# Altium footprint library PcbLib1.PcbLib: 170 footprints (part 8 of 11)
Each footprint in its own frame and in the unit in brackets; x right, y up, seen from the top. Pads: shape width x height; smd on the part's side, far side on the other; paste and mask are expansions set on the pad; w line width, h text height; cw(c..) or ccw(c..) is an arc to the next point about the centre after c.
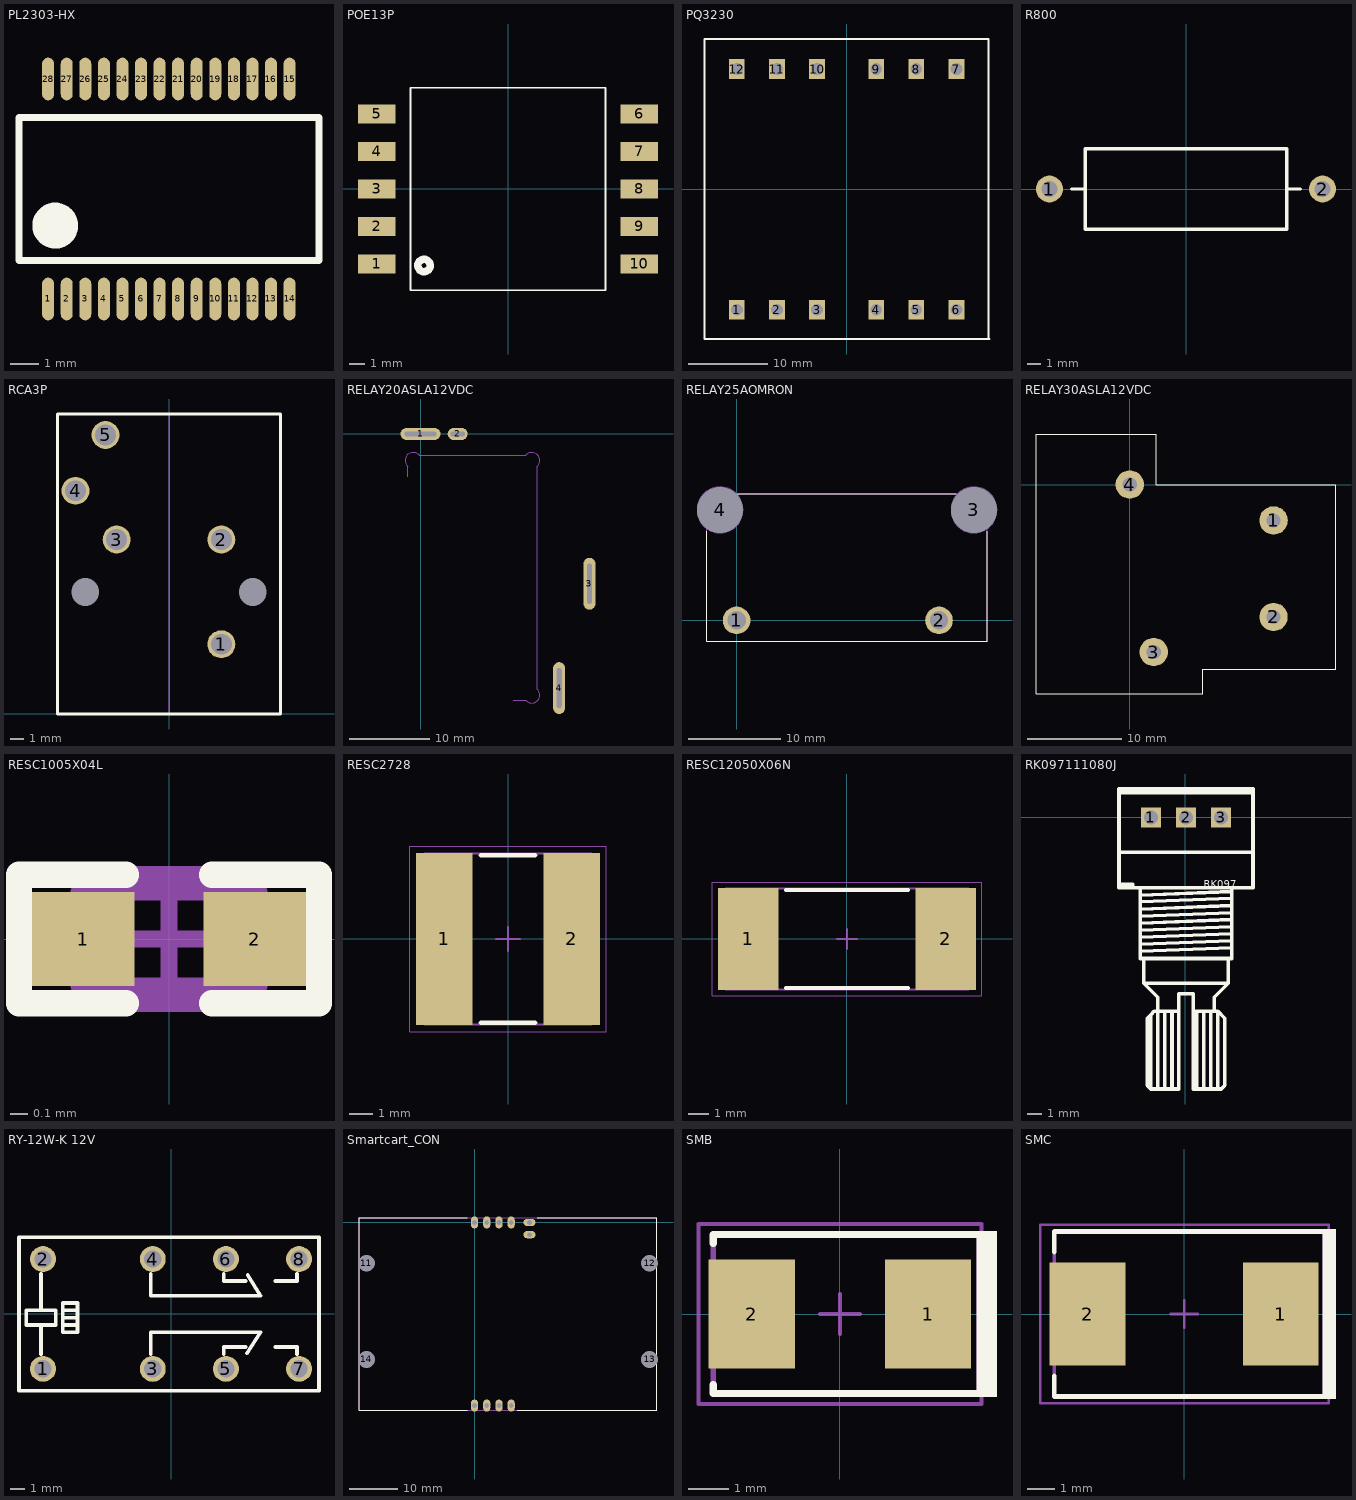
[diagram p7: the footprints below, top view; thin cyan lines are the x and y axes]

## PL2303-HX [mil]
pads (28):
  oval 16.53x59.03 smd mask+7.9: 1(749.3,913.5) 2(774.9,913.5) 3(800.48,913.5) 4(826.08,913.5) 5(851.67,913.5) 6(877.27,913.5) 7(902.87,913.5) 8(928.45,913.5) 9(954.05,913.5) 10(979.65,913.5) 11(1005.23,913.5) 12(1030.83,913.5) 13(1056.42,913.5) 14(1082,913.5) 15(1082,1216.68) 16(1056.42,1216.68) 17(1030.83,1216.68) 18(1005.23,1216.68) 19(979.65,1216.68) 20(954.05,1216.68) 21(928.45,1216.68) 22(902.87,1216.68) 23(877.27,1216.68) 24(851.67,1216.68) 25(826.08,1216.68) 26(800.48,1216.68) 27(774.9,1216.68) 28(749.3,1216.68)
Top Overlay:
  circle w39.37: c759.15,1014.68 r11.88
  lines w10: 709.13,966.65 1122.57,966.65 1122.57,1163.52 709.13,1163.52 709.13,966.65

## POE13P [mm] "POE13P"
pads (10):
  rect 2.5x1.27 smd paste+0: 1(-8.75,-5) 2(-8.75,-2.5) 3(-8.75,0) 4(-8.75,2.5) 5(-8.75,5) 6(8.75,5) 7(8.75,2.5) 8(8.75,0) 9(8.75,-2.5) 10(8.75,-5)
Top Overlay:
  lines w0.127: -6.5,-6.75 6.5,-6.75 6.5,6.75 -6.5,6.75 -6.5,-6.75
  lines w0.5: -5.388,-4.746 ccw(c-5.6,-5.1) -5.371,-4.757

## PQ3230 [mm]
pads (12):
  rect 2x2.5 hole 1.5: 1(-13.905,-15.24) 2(-8.825,-15.24) 3(-3.745,-15.24) 4(3.745,-15.24) 5(8.825,-15.24) 6(13.905,-15.24) 7(13.905,15.24) 8(8.825,15.24) 9(3.745,15.24) 10(-3.745,15.24) 11(-8.825,15.24) 12(-13.905,15.24)
Top Overlay:
  lines w0.254: -18,-18.95 -18,19.05 18,19.05 18,-18.95 ; -17.9,-18.95 18.1,-18.95

## R800 [mm]
pads (2):
  round 2 hole 1.2: 1(-10.16,0) 2(10.16,0)
Top Overlay:
  lines w0.254: -8.5,0 -7.5,0 ; 7.5,0 8.5,0 ; -7.5,-3 -7.5,3 7.5,3 7.5,-3 -7.5,-3

## RCA3P [mm]
pads (7):
  round 2 hole 1.5 paste+0: 1(3.75,5) 2(3.75,12.5) 3(-3.75,12.5) 4(-6.7,16) 5(-4.55,20)
  round 0 hole 2 square paste+0: NC(-6,8.75) NC(6,8.75)
Top Overlay:
  lines w0.2: -8,21.5 8,21.5 8,0 -8,0 -8,21.5 ; -8,21.5 -8,21.5
Mechanical 1:
  lines w0.1: 0,0 0,21.5

## RELAY20ASLA12VDC [mm]
pads (4):
  oval 5x1.5 hole 0.6 slot 4 at 0 deg paste+0: 1(0,0)
  oval 2.5x1.5 hole 0.6 slot 1.8 at 0 deg paste+0: 2(4.65,0)
  oval 1.5x6.5 hole 0.6 slot 5 at 90 deg paste+0: 3(21.15,-18.75) 4(17.35,-31.8)
Mechanical 13:
  lines w0.01: 0,-0.28 0,0.28 ; 4.65,-0.28 4.65,0.28 ; 17.07,-31.8 17.63,-31.8 ; 20.87,-18.75 21.43,-18.75
  lines w0.013: -1.6,-5.358 -1.6,-4.063 cw(c-0.928,-3.322) -0.187,-2.65 13.187,-2.65 cw(c13.928,-3.322) 14.6,-4.063 14.6,-31.937 cw(c13.928,-32.678) 13.187,-33.35 11.6,-33.35 ; -1.4,-0.28 cw(c-1.4,0) -1.4,0.28 1.4,0.28 cw(c1.4,0) 1.4,-0.28 -1.4,-0.28 ; 4.15,-0.28 cw(c4.15,0) 4.15,0.28 5.15,0.28 cw(c5.15,0) 5.15,-0.28 4.15,-0.28 ; 17.07,-33.7 ccw(c17.35,-33.7) 17.63,-33.7 17.63,-33.55 17.63,-29.9 ccw(c17.35,-29.9) 17.07,-29.9 17.07,-33.7 ; 20.87,-20.65 ccw(c21.15,-20.65) 21.43,-20.65 21.43,-16.85 ccw(c21.15,-16.85) 20.87,-16.85 20.87,-20.65
3D body: height 19.8, standoff -8.5, extent -1.595,-33.68 21.305,0.37

## RELAY25AOMRON [mm]
pads (4):
  round 3 hole 2 paste+0: 1(0,0) 2(22,0)
  round 3 hole 5 paste+0: 3(25.8,12) 4(-1.8,12)
Top Overlay:
  lines w0.1: -3.25,9.71 -3.25,-2.25 27.25,-2.25 27.25,9.71 ; 0.1,13.75 23.85,13.75
Mechanical 13:
  circle w0.013: c22,0 r0.9
  circle w0.013: c0,0 r0.9
  circle w0.013: c25.8,12 r2.5
  circle w0.013: c-1.8,12 r2.5
  lines w0.013: -2.55,12 -1.05,12 ; -1.8,11.25 -1.8,12.75 ; -0.75,0 0.75,0 ; 0,-0.75 0,0.75 ; 21.25,0 22.75,0 ; 22,-0.75 22,0.75 ; 25.05,12 26.55,12 ; 25.8,11.25 25.8,12.75 ; -3.25,-2.25 27.25,-2.25 27.25,13.75 -3.25,13.75 -3.25,-2.25

## RELAY30ASLA12VDC [mm]
pads (4):
  round 3 hole 1.5 paste+0 mask+0: 1(15.202,-3.8) 2(15.2,-14) 3(2.54,-17.7) 4(0,0)
Top Overlay:
  lines w0.1: -9.9,-22.1 7.7,-22.1 7.7,-19.5 21.8,-19.5 21.8,0 2.8,0 2.8,5.3 -9.9,5.3 -9.9,-22.1
Mechanical 1:
  circle w0.013: c15.2,-3.8 r0.4
  circle w0.013: c2.54,-17.7 r0.85
  circle w0.013: c15.2,-14 r0.4
  circle w0.013: c0,0 r0.85

## RESC1005X04L [mm] "Chip Resistor, 2-Leads, Body 1.0x0.5mm, IPC High Density"
height 0.4
pads (2):
  rect 0.6x0.55 smd: 1(-0.5,0) 2(0.5,0)
Top Overlay:
  lines w0.152: -0.25,-0.375 -0.875,-0.375 -0.875,0.375 -0.25,0.375 ; 0.25,-0.375 0.875,-0.375 0.875,0.375 0.25,0.375
Mechanical 13:
  lines w0.1: -0.525,-0.275 -0.525,0.275 0.525,0.275 0.525,-0.275 -0.525,-0.275
Mechanical 15:
  lines w0.1: -0.275,0 0.275,0 ; 0,-0.275 0,0.275 ; -0.875,-0.375 0.875,-0.375 0.875,0.375 -0.875,0.375 -0.875,-0.375
3D body: height 0.3, standoff 0, extent -0.5,-0.25 0.5,0.25

## RESC2728 [mm] "Chip Resistor, 2-Leads, Body 6.9x7.1mm, IPC Medium Density"
height 0.6
pads (2):
  rect 2.4x7.35 smd: 1(-2.725,0) 2(2.725,0)
Top Overlay:
  lines w0.2: -1.15,-3.575 1.15,-3.575 ; -1.15,3.575 1.15,3.575
Mechanical 13:
  lines w0.1: -3.55,-3.65 3.55,-3.65 3.55,3.65 -3.55,3.65 -3.55,-3.65
Mechanical 15:
  lines w0.05: -4.2,-3.95 4.2,-3.95 4.2,3.95 -4.2,3.95 -4.2,-3.95
  lines w0.1: -0.5,0 0.5,0 ; 0,-0.5 0,0.5
3D body: height 0.6, standoff 0, extent 1.55,-3.65 3.55,3.65
3D body: height 0.6, standoff 0, extent -3.55,-3.65 -1.55,3.65
3D body: height 0.6, standoff 0, extent -1.55,-3.65 1.55,3.65

## RESC12050X06N [mm] "Chip Resistor, 2-Leads, Body 12.00x5.00mm, IPC Medium Density"
height 0.6
pads (2):
  rect 3x5.05 smd: 1(-4.875,0) 2(4.875,0)
Top Overlay:
  lines w0.2: -3,-2.425 3,-2.425 ; -3,2.425 3,2.425
Mechanical 13:
  lines w0.1: -6,-2.5 -6,2.5 6,2.5 6,-2.5 -6,-2.5
Mechanical 15:
  lines w0.05: -6.65,-2.8 -6.65,2.8 6.65,2.8 6.65,-2.8 -6.65,-2.8
  lines w0.1: -0.5,0 0.5,0 ; 0,-0.5 0,0.5
3D body: height 0.6, standoff 0, extent -3.4,-2.5 3.4,2.5
3D body: height 0.6, standoff 0, extent -6,-2.5 -3.4,2.5
3D body: height 0.6, standoff 0, extent 3.4,-2.5 6,2.5

## RK097111080J [mil]
pads (3):
  rect 56x56 hole 39.4: 1(-96,0) 2(2,0) 3(100,0)
Top Overlay:
  lines w10: -57,-541 -57,-758 ; -37,-541 -37,-758 ; 32,-541 32,-758 ; 51,-541 51,-758 ; 71,-541 71,-758 ; -185,-187 -146,-187 -146,-197 ; -185,-187 -185,-197 -146,-197 ; -185,-187 -185,-98 ; -185,-98 189,-98 ; -185,-98 -185,69 ; -185,69 -96,69 ; -185,69 -185,79 -96,79 ; -146,-197 -126,-197 ; -126,-374 130,-364 ; -126,-374 -126,-354 ; -126,-374 -126,-394 -116,-394 ; -126,-354 130,-344 ; -126,-354 -126,-335 ; -126,-335 130,-325 ; -126,-335 -126,-315 ; -126,-315 130,-305 ; -126,-315 -126,-295 ; -126,-295 130,-285 ; -126,-295 -126,-276 ; -126,-276 130,-266 ; -126,-276 -126,-256 ; -126,-256 130,-246 ; -126,-256 -126,-236 ; -126,-236 130,-226 ; -126,-236 -126,-217 ; -126,-217 130,-207 ; -126,-217 -126,-197 ; -126,-197 130,-197 ; -116,-463 120,-463 ; -116,-463 -77,-502 -77,-541 ; -116,-463 -116,-394 ; -116,-394 120,-394 ; -96,-758 -96,-551 ; -96,-758 -77,-758 ; -96,-758 -106,-748 -106,-561 -96,-551 ; -96,-551 -87,-541 -77,-541 ; -96,69 -96,79 ; -96,69 189,69 ; -96,79 189,79 189,69 ; -77,-758 -77,-541 ; -77,-758 -57,-758 ; -77,-541 -18,-541 ; -57,-758 -37,-758 ; -37,-758 -18,-758 -18,-541 ; -18,-541 -18,-492 22,-492 22,-541 ; 22,-541 81,-541 ; 22,-541 22,-758 32,-758 ; 32,-758 51,-758 ; 51,-758 71,-758 ; 71,-758 91,-758 ; 81,-541 91,-541 ; 81,-541 81,-502 120,-463 ; 91,-758 91,-541 ; 91,-758 100,-758 110,-748 110,-561 91,-541 ; 120,-463 120,-394 ; 120,-394 130,-394 130,-364 ; 130,-364 130,-344 ; 130,-344 130,-325 ; 130,-325 130,-305 ; 130,-305 130,-285 ; 130,-285 130,-266 ; 130,-266 130,-246 ; 130,-246 130,-226 ; 130,-226 130,-207 ; 130,-207 130,-197 ; 130,-197 189,-197 189,-98 ; 189,-98 189,69
  text "RK097" at 51,-197 h20

## RY-12W-K 12V [mm]
pads (8):
  round 1.8 hole 1.2: 1(-8.89,-3.81) 2(-8.89,3.81) 3(-1.27,-3.81) 4(-1.27,3.81) 5(3.81,-3.81) 6(3.81,3.81) 7(8.89,-3.81) 8(8.89,3.81)
Top Overlay:
  lines w0.254: -9.032,-2.8 -9.032,-0.768 ; -9.032,2.788 -9.032,0.248 ; -7.508,-0.768 -6.492,-0.768 ; -7.508,-0.26 -6.492,-0.26 ; -7.508,0.248 -6.492,0.248 ; -1.412,-2.8 -1.412,-1.276 6.208,-1.276 5.265,-2.736 ; -1.412,2.788 -1.412,1.264 3.668,1.264 6.208,1.264 5.315,2.714 ; 3.668,-2.8 3.668,-2.292 5.192,-2.292 ; 3.668,2.788 3.668,2.28 5.192,2.28 ; 7.224,-2.292 8.748,-2.292 8.748,-2.8 ; 7.224,2.28 8.748,2.28 8.748,2.788 ; -9.032,-0.768 -10.048,-0.768 -10.048,0.248 -9.032,0.248 ; -9.032,-0.768 -8.016,-0.768 -8.016,0.248 -9.032,0.248 ; -10.556,-5.34 -10.556,5.328 10.272,5.328 10.272,-5.34 -10.556,-5.34 ; -7.508,-1.276 -6.492,-1.276 -6.492,0.756 -7.508,0.756 -7.508,-1.276
3D body: height 12, standoff -3, extent -10.25,-5.05 10.25,5.05

## Smartcart_CON [mm]
pads (14):
  oval 1.5x2.5 hole 1 paste+0 mask+0: 1(0,0) 2(2.54,0) 3(5.08,0) 4(7.62,0) 5(0,-38.1) 6(2.54,-38.1) 7(5.08,-38.1) 8(7.62,-38.1)
  oval 2.5x1.5 hole 1 paste+0 mask+0: 9(11.43,0) 10(11.43,-2.54)
  round 3 hole 3.5 paste+0 mask+0: 11(-22.5,-8.5) 12(36.425,-8.5) 13(36.425,-28.5) 14(-22.5,-28.5)
Top Overlay:
  lines w0.2: -1.53,1 -24,1 -24,-39.1 -1.5,-39.1 ; 8.93,-39.1 37.93,-39.1 37.93,1 13.03,1
Mechanical 3:
  lines w0.2: -24,-39.1 -24,0.932 -23.932,1 37.93,1 37.93,0 37.93,-39.1 -24,-39.1

## SMB [mm] "Molded Diode, 2-Leads, Body 5.4x3.6mm, IPC Medium Density, based on OnSemi component dimensions"
height 2.45
pads (2):
  rect 2.159x2.743 smd: 1(2.21,0) 2(-2.21,0)
Top Overlay:
  region: 3.937,2.083 3.429,2.083 3.429,-2.083 3.937,-2.083
  lines w0.178: -3.175,-1.765 -3.175,-1.994 3.607,-1.994 ; -3.175,1.765 -3.175,1.994 3.607,1.994
Mechanical 5:
  region: 3.937,2.083 3.429,2.083 3.429,-2.083 3.937,-2.083
  lines w0.127: 3.607,-1.994 -3.175,-1.994 -3.175,-1.765 -3.175,1.765 -3.175,1.994 3.607,1.994
Mechanical 15:
  lines w0.1: -0.5,0 0.5,0 ; 0,-0.5 0,0.5 ; -3.55,-2.25 3.55,-2.25 3.55,2.25 -3.55,2.25 -3.55,-2.25
3D body: height 2.32, standoff 0.02, extent -2.7,-1.8 2.7,1.8

## SMC [mil] "Molded Diode, 2-Leads, Body 6.9x5.8mm, IPC Medium Density, based on OnSemi component dimensions and land patterns"
height 94.88
pads (2):
  rect 110x150 smd: 1(140.49,0) 2(-140.49,0)
Top Overlay:
  region: 221,123.5 201,123.5 201,-123.5 221,-123.5
  lines w7: -189,-90.25 -189,-120 210,-120 ; -189,90.25 -189,120 210,120
Mechanical 5:
  region: 221,123.5 201,123.5 201,-123.5 221,-123.5
  lines w5: 210,-120 -189,-120 -189,120 210,120
Mechanical 15:
  lines w3.94: -19.68,0 19.69,0 ; 0,-19.69 0,19.68 ; -209.38,-129.92 210.46,-129.92 210.46,129.92 -209.38,129.92 -209.38,-129.92
3D body: height 91.35, standoff 0.6, extent -156.5,-116.15 156.49,116.14